# Altium footprint library custom.PcbLib: 317 footprints (part 3 of 20)
Each footprint in its own frame and in the unit in brackets; x right, y up, seen from the top. Pads: shape width x height; smd on the part's side, far side on the other; paste and mask are expansions set on the pad; w line width, h text height; cw(c..) or ccw(c..) is an arc to the next point about the centre after c.
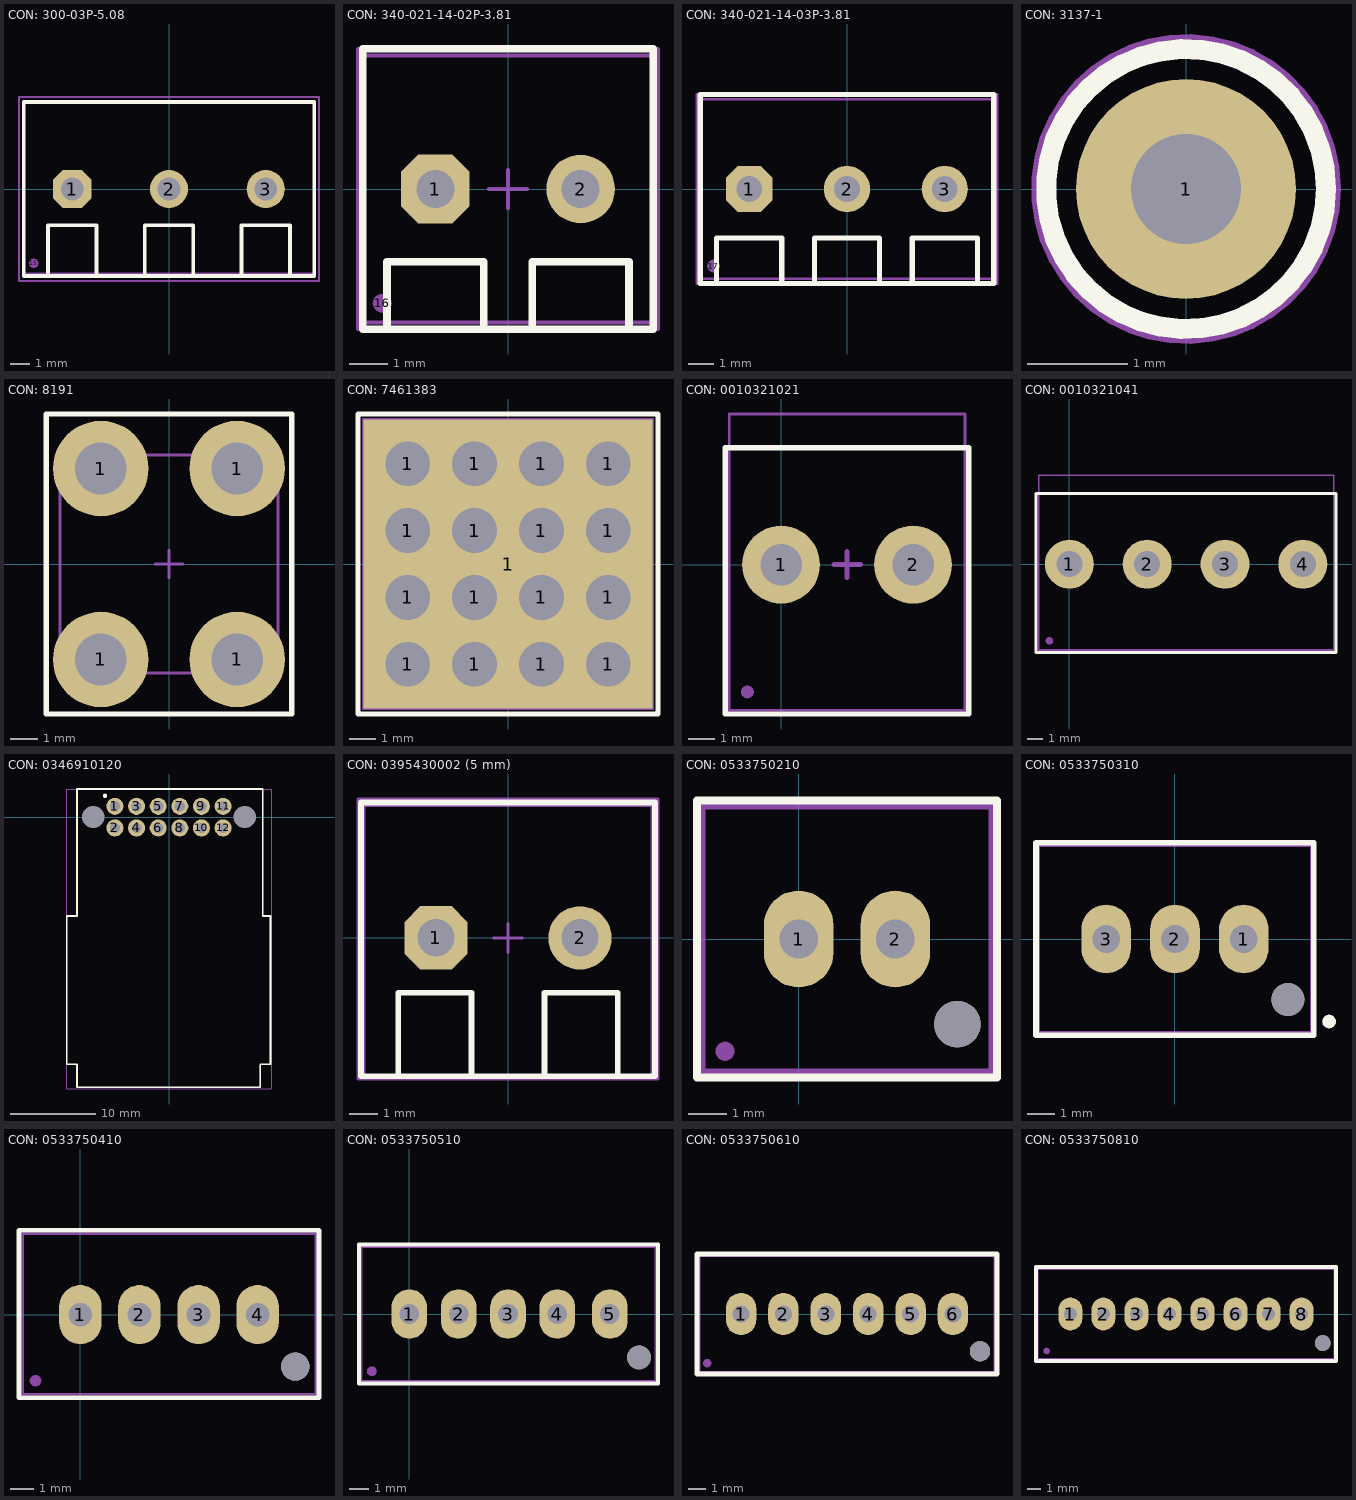
[diagram p2: the footprints below, top view; thin cyan lines are the x and y axes]

## CON: 300-03P-5.08 [mm] "3 pin 5.08mm screw connector"
height 12.5
pads (4):
  oct 2x2 hole 1.2: 1(-5.08,0)
  round 2 hole 1.2: 2(0,0) 3(5.08,0)
  round 0.5 on Mech1: 15(-7.1,-3.9)
Top Overlay:
  lines w0.2: -6.35,-4.572 -6.35,-1.905 -3.81,-1.905 -3.81,-4.445 ; -1.27,-4.572 -1.27,-1.905 1.27,-1.905 1.27,-4.445 ; 3.81,-4.572 3.81,-1.905 6.35,-1.905 6.35,-4.445 ; -7.62,-4.572 7.62,-4.572 7.62,4.572 -7.62,4.572 -7.62,-4.572
Top Assy:
  lines w0.1: -7.62,-4.445 -7.62,4.555 7.62,4.555 7.62,-4.445 -7.62,-4.445
Size Area:
  lines w0.1: -0.5,0 0.5,0 ; 0,-0.5 0,0.5 ; -7.874,-4.826 7.874,-4.826 7.874,4.826 -7.874,4.826 -7.874,-4.826
3D body "300-03.STEP": height 12.5, standoff -4, extent -7.62,-4.445 7.62,4.555

## CON: 340-021-14-02P-3.81 [mm] "3.81 2pin screw connector"
height 9
pads (3):
  oct 1.8x1.8 hole 1: 1(-1.905,0)
  round 1.8 hole 1: 2(1.905,0)
  round 0.5 on Mech1: 16(-3.3,-3)
Top Overlay:
  lines w0.2: -3.175,-3.683 -3.175,-1.905 -0.635,-1.905 -0.635,-3.683 ; 0.635,-3.683 0.635,-1.905 3.175,-1.905 3.175,-3.683 ; -3.81,-3.683 -3.81,3.683 3.81,3.683 3.81,-3.683 -3.81,-3.683
Top Assy:
  lines w0.1: -3.815,-3.5 -3.815,3.5 3.805,3.5 3.805,-3.5 -3.815,-3.5
Size Area:
  lines w0.1: -0.5,0 0.5,0 ; 0,-0.5 0,0.5 ; -3.937,-3.683 -3.937,3.683 3.937,3.683 3.937,-3.683 -3.937,-3.683
3D body "340-021-14.STEP": height 8.5, standoff -4, extent -3.815,-3.5 3.805,3.5

## CON: 340-021-14-03P-3.81 [mm] "3.81 3pin screw connector"
height 9
pads (4):
  oct 1.8x1.8 hole 1: 1(-3.81,0)
  round 1.8 hole 1: 2(0,0) 3(3.81,0)
  round 0.5 on Mech1: 17(-5.2,-3)
Top Overlay:
  lines w0.2: -5.08,-3.683 -5.08,-1.905 -2.54,-1.905 -2.54,-3.683 ; -1.27,-3.683 -1.27,-1.905 1.27,-1.905 1.27,-3.683 ; 2.54,-3.683 2.54,-1.905 5.08,-1.905 5.08,-3.683 ; -5.715,-3.683 5.715,-3.683 5.715,3.683 -5.715,3.683 -5.715,-3.683
Top Assy:
  lines w0.1: -5.715,-3.5 -5.715,3.5 5.715,3.5 5.715,-3.5 -5.715,-3.5
Size Area:
  lines w0.1: -0.5,0 0.5,0 ; 0,-0.5 0,0.5 ; -5.842,-3.683 5.842,-3.683 5.842,3.683 -5.842,3.683 -5.842,-3.683
3D body "340-021-14-3pin.STEP": height 8.5, standoff -4, extent -5.715,-3.5 5.715,3.5

## CON: 3137-1 [mm]
pads (1):
  round 2.2 hole 1.1: 1(0,0)
Top Overlay:
  circle w0.2: c0,0 r1.4
Top Assy:
  circle w0.1: c0,0 r1.4
Size Area:
  circle w0.1: c0,0 r1.5
3D body "mill-max-3137-1-00-15-00-00-08-0.STEP": height 1.1, standoff -6.57, extent -0.775,-0.775 0.8,0.8

## CON: 8191 [mm]
pads (4):
  round 3.5 hole 1.9: 1(-2.5,-3.5) 1(-2.5,3.5) 1(2.5,-3.5) 1(2.5,3.5)
Top Overlay:
  lines w0.2: -4.5,-5.5 -4.5,-2.5 -4.5,5.5 4.5,5.5 4.5,-5.5 -4.5,-5.5
Top Assy:
  lines w0.1: -4,-4 -4,4 4,4 4,-4 -4,-4
Size Area:
  lines w0.1: -0.5,0 0.5,0 ; 0,-0.5 0,0.5 ; -4.5,-5.5 -4.5,5.5 4.5,5.5 4.5,-5.5 -4.5,-5.5
3D body "User Library-Terminal 10A Keystone 8191.STEP": height 7.05, standoff -4.45, extent -4,-4 4,4

## CON: 7461383 [mm]
pads (17):
  round 3 hole 1.7: 1(-3.81,-3.81) 1(-3.81,-1.27) 1(-3.81,1.27) 1(-3.81,3.81) 1(-1.27,-3.81) 1(-1.27,-1.27) 1(-1.27,1.27) 1(-1.27,3.81) 1(1.27,-3.81) 1(1.27,-1.27) 1(1.27,1.27) 1(1.27,3.81) 1(3.81,-3.81) 1(3.81,-1.27) 1(3.81,1.27) 1(3.81,3.81)
  rect 11x11 smd: 1(0,0)
Top Overlay:
  lines w0.2: -5.7,-5.7 5.7,-5.7 5.7,5.7 -5.7,5.7 -5.7,-5.7
Top Assy:
  lines w0.1: -4.5,-4.5 4.5,-4.5 4.5,4.5 -4.5,4.5 ; -4.5,-4.5 -4.5,-4.5 ; -4.5,-4.5 -4.5,4.5 ; -4.5,4.5 -4.5,4.5
Size Area:
  lines w0.1: -0.5,0 0.5,0 ; 0,-0.5 0,0.5 ; -5.5,-5.5 -5.5,5.5 5.5,5.5 5.5,-5.5 -5.5,-5.5
3D body "7461383.STEP": height 12.5, standoff -3.5, extent -4.5,-4.5 4.5,4.5

## CON: 0010321021 [mm]
pads (3):
  round 3 hole 1.6: 1(0,0) 2(5.08,0)
  round 0.5 on Mech1: ""(-1.3,-4.9)
Top Overlay:
  lines w0.2: -2.15,-5.75 -2.15,4.5 7.225,4.5 7.225,-5.75 -2.15,-5.75
Top Assy:
  lines w0.1: -2,-5.6 -2,5.8 7.08,5.8 7.08,-5.6 -2,-5.6
Size Area:
  lines w0.2: 2.05,0 3.05,0 ; 2.54,-0.5 2.54,0.5
3D body "010321021.stp": height 13.85, standoff -3.6, extent -2,-5.6 7.08,5.8

## CON: 0010321041 [mm]
pads (5):
  round 3.2 hole 1.7: 1(0,0) 2(5.08,0) 3(10.16,0) 4(15.24,0)
  round 0.5 on Mech1: ""(-1.3,-5)
Top Overlay:
  lines w0.2: -2.175,-5.775 17.4,-5.775 17.4,4.6 -2.175,4.6 -2.175,-5.775
Top Assy:
  lines w0.1: -2,-5.6 17.24,-5.6 17.24,5.8 -2,5.8 -2,-5.6
3D body "010321041.stp": height 13.85, standoff -3.6, extent -2,-5.6 17.24,5.8

## CON: 0346910120 [mm]
pads (16):
  round 2 hole 1.2: 1(-6.35,1.27) 2(-6.35,-1.27) 3(-3.81,1.27) 4(-3.81,-1.27) 5(-1.27,1.27) 6(-1.27,-1.27) 7(1.27,1.27) 8(1.27,-1.27) 9(3.81,1.27) 10(3.81,-1.27) 11(6.35,1.27) 12(6.35,-1.27)
  round 0 hole 2.6: ""(-8.89,0) ""(8.89,0)
  round 0.5 on Top Overlay: ""(-7.5,2.5)
  round 0.5 on Mech1: ""(-7.5,2.5)
Top Overlay:
  lines w0.2: -12,-29 -12,-11.6 -10.8,-11.6 -10.8,3.3 11,3.3 11,-11.6 11.9,-11.6 11.9,-29 10.7,-29 10.7,-31.7 -10.8,-31.7 -10.8,-29 -12,-29
Top Assy:
  lines w0.1: -12,-29 -10.8,-29 -10.8,-31.7 10.7,-31.7 10.7,-29 11.9,-29 11.9,-11.6 11,-11.6 11,3.3 -10.8,3.3 -10.8,-11.6 -12,-11.6 -12,-29
Size Area:
  lines w0.1: -12,-31.9 12,-31.9 12,3.3 -12,3.3 -12,-31.9
3D body "2.STEP": height 22.06, standoff -3.4, extent -12,-31.882 11.94,3.282

## CON: 0395430002 (5 mm) [mm] "2 pin 5.08mm screw connector"
height 12.5
pads (2):
  oct 2.2x2.2 hole 1.3: 1(-2.5,0)
  round 2.2 hole 1.3: 2(2.5,0)
Top Overlay:
  lines w0.2: -3.81,-4.8 -3.81,-1.905 -1.27,-1.905 -1.27,-4.8 ; 1.27,-4.8 1.27,-1.905 3.81,-1.905 3.81,-4.8 ; -5.1,-4.8 -5.1,4.7 5.1,4.7 5.1,-4.8 -5.1,-4.8
Top Assy:
  lines w0.1: -3.8,-4.799 -3.8,-1.9 -1.3,-1.9 -1.3,-4.799 ; 1.3,-4.8 1.3,-1.9 3.8,-1.9 3.8,-4.799 ; -5.004,-4.799 5.004,-4.799 5.004,4.599 -5.004,4.599 -5.004,-4.799
Size Area:
  lines w0.1: -0.5,0 0.5,0 ; 0,-0.5 0,0.5 ; -5.207,-4.9 -5.207,4.826 5.207,4.826 5.207,-4.9 -5.207,-4.9
3D body "395430002.SLDPRT": height 14.63, standoff -3.43, extent -5.004,-4.799 5.004,4.599

## CON: 0533750210 [mm] "MOLEX Mini-Lock"
height 11.5
pads (4):
  oval 1.8x2.5 hole 1: 1(0,0) 2(2.5,0)
  round 0.5 on Mech1: ""(-1.9,-2.9)
  round 1.2 hole 1.2: ""(4.1,-2.2)
Top Overlay:
  lines w0.2: -2.625,-3.575 -2.625,3.575 5.125,3.575 5.125,-3.575 -2.625,-3.575
Top Assy:
  lines w0.1: -2.45,-3.4 -2.45,3.4 4.95,3.4 4.95,-3.4 -2.45,-3.4
Size Area:
  lines w0.1: -2.5,-3.5 5,-3.5 5,3.5 -2.5,3.5 -2.5,-3.5
3D body "533750210.stp": height 11.75, standoff -3.18, extent -2.45,-3.4 4.95,3.4

## CON: 0533750310 [mm]
pads (6):
  oval 1.8x2.5 hole 1: 1(2.5,0) 2(0,0) 3(-2.5,0)
  round 1.2 hole 1.2: ""(4.1,-2.2)
  round 0.5 on Mech1: ""(4.1,-2.2)
  round 0.5 on Top Overlay: ""(5.6,-3)
Top Overlay:
  lines w0.2: -5.05,-3.5 -5.05,3.5 5.05,3.5 5.05,-3.5 -5.05,-3.5
Top Assy:
  lines w0.1: -4.95,-3.4 4.95,-3.4 4.95,3.4 -4.95,3.4 -4.95,-3.4
Size Area:
  lines w0.1: -0.5,0 0.5,0 ; 0,-0.5 0,0.5 ; -5,-3.5 -5,3.5 5,3.5 5,-3.5 -5,-3.5
3D body "533750310.stp": height 11.55, standoff -3.38, extent -4.95,-3.4 4.95,3.4

## CON: 0533750410 [mm] "MOLEX Mini-Lock"
height 11.5
pads (6):
  oval 1.8x2.5 hole 1: 1(0,0) 2(2.5,0) 3(5,0) 4(7.5,0)
  round 0.5 on Mech1: ""(-1.9,-2.8)
  round 1.2 hole 1.2: ""(9.1,-2.2)
Top Overlay:
  lines w0.2: -2.6,-3.525 -2.6,3.575 10.1,3.575 10.1,-3.525 -2.6,-3.525
Top Assy:
  lines w0.1: -2.441,-3.374 -2.441,3.426 9.959,3.426 9.959,-3.374 -2.441,-3.374
3D body "533750410.stp": height 11.55, standoff -3.38, extent -2.441,-3.374 9.959,3.426

## CON: 0533750510 [mm] "MOLEX Mini-Lock"
height 11.5
pads (7):
  oval 1.8x2.5 hole 1: 1(0,0) 2(2.5,0) 3(5,0) 4(7.5,0) 5(10.16,0)
  round 0.5 on Mech1: ""(-1.9,-2.9)
  round 1.2 hole 1.2: ""(11.64,-2.2)
Top Overlay:
  lines w0.2: -2.55,-3.525 12.6,-3.525 12.6,3.525 -2.55,3.525 -2.55,-3.525
Top Assy:
  lines w0.1: -2.425,-3.4 -2.425,3.4 12.475,3.4 12.475,-3.4 -2.425,-3.4
Size Area:
  lines w0.1: -2.6,-3.5 12.6,-3.5 12.6,3.5 -2.6,3.5 -2.6,-3.5
3D body "533750510.stp": height 11.55, standoff -3.38, extent -2.425,-3.4 12.475,3.4

## CON: 0533750610 [mm] "MOLEX Mini-Lock"
height 11.5
pads (8):
  oval 1.8x2.5 hole 1: 1(10,0) 2(12.5,0) 3(15,0) 4(17.5,0) 5(20,0) 6(22.5,0)
  round 0.5 on Mech1: ""(8,-2.9)
  round 1.2 hole 1.2: ""(24.1,-2.2)
Top Overlay:
  lines w0.3: 7.4,-3.55 7.4,3.55 25.1,3.55 25.1,-3.55 7.4,-3.55
Top Assy:
  lines w0.1: 7.55,-3.4 24.95,-3.4 24.95,3.4 7.55,3.4 7.55,-3.4
3D body "533750610.stp": height 11.55, standoff -3.38, extent 7.55,-3.4 24.95,3.4

## CON: 0533750810 [mm] "MOLEX Mini-Lock"
height 11.5
pads (10):
  oval 1.8x2.5 hole 1: 1(5,0) 2(7.5,0) 3(10,0) 4(12.5,0) 5(15,0) 6(17.5,0) 7(20,0) 8(22.5,0)
  round 0.5 on Mech1: ""(3.2,-2.8)
  round 1.2 hole 1.2: ""(24.1,-2.2)
Top Overlay:
  lines w0.3: 2.4,-3.55 25.1,-3.55 25.1,3.55 2.4,3.55 2.4,-3.55
Top Assy:
  lines w0.1: 2.55,-3.4 24.95,-3.4 24.95,3.4 2.55,3.4 2.55,-3.4
3D body "533750810.stp": height 11.55, standoff -3.38, extent 2.55,-3.4 24.95,3.4